# Altium footprint library Connectors.PcbLib: 245 footprints (part 13 of 18)
Each footprint in its own frame and in the unit in brackets; x right, y up, seen from the top. Pads: shape width x height; smd on the part's side, far side on the other; paste and mask are expansions set on the pad; w line width, h text height; cw(c..) or ccw(c..) is an arc to the next point about the centre after c.
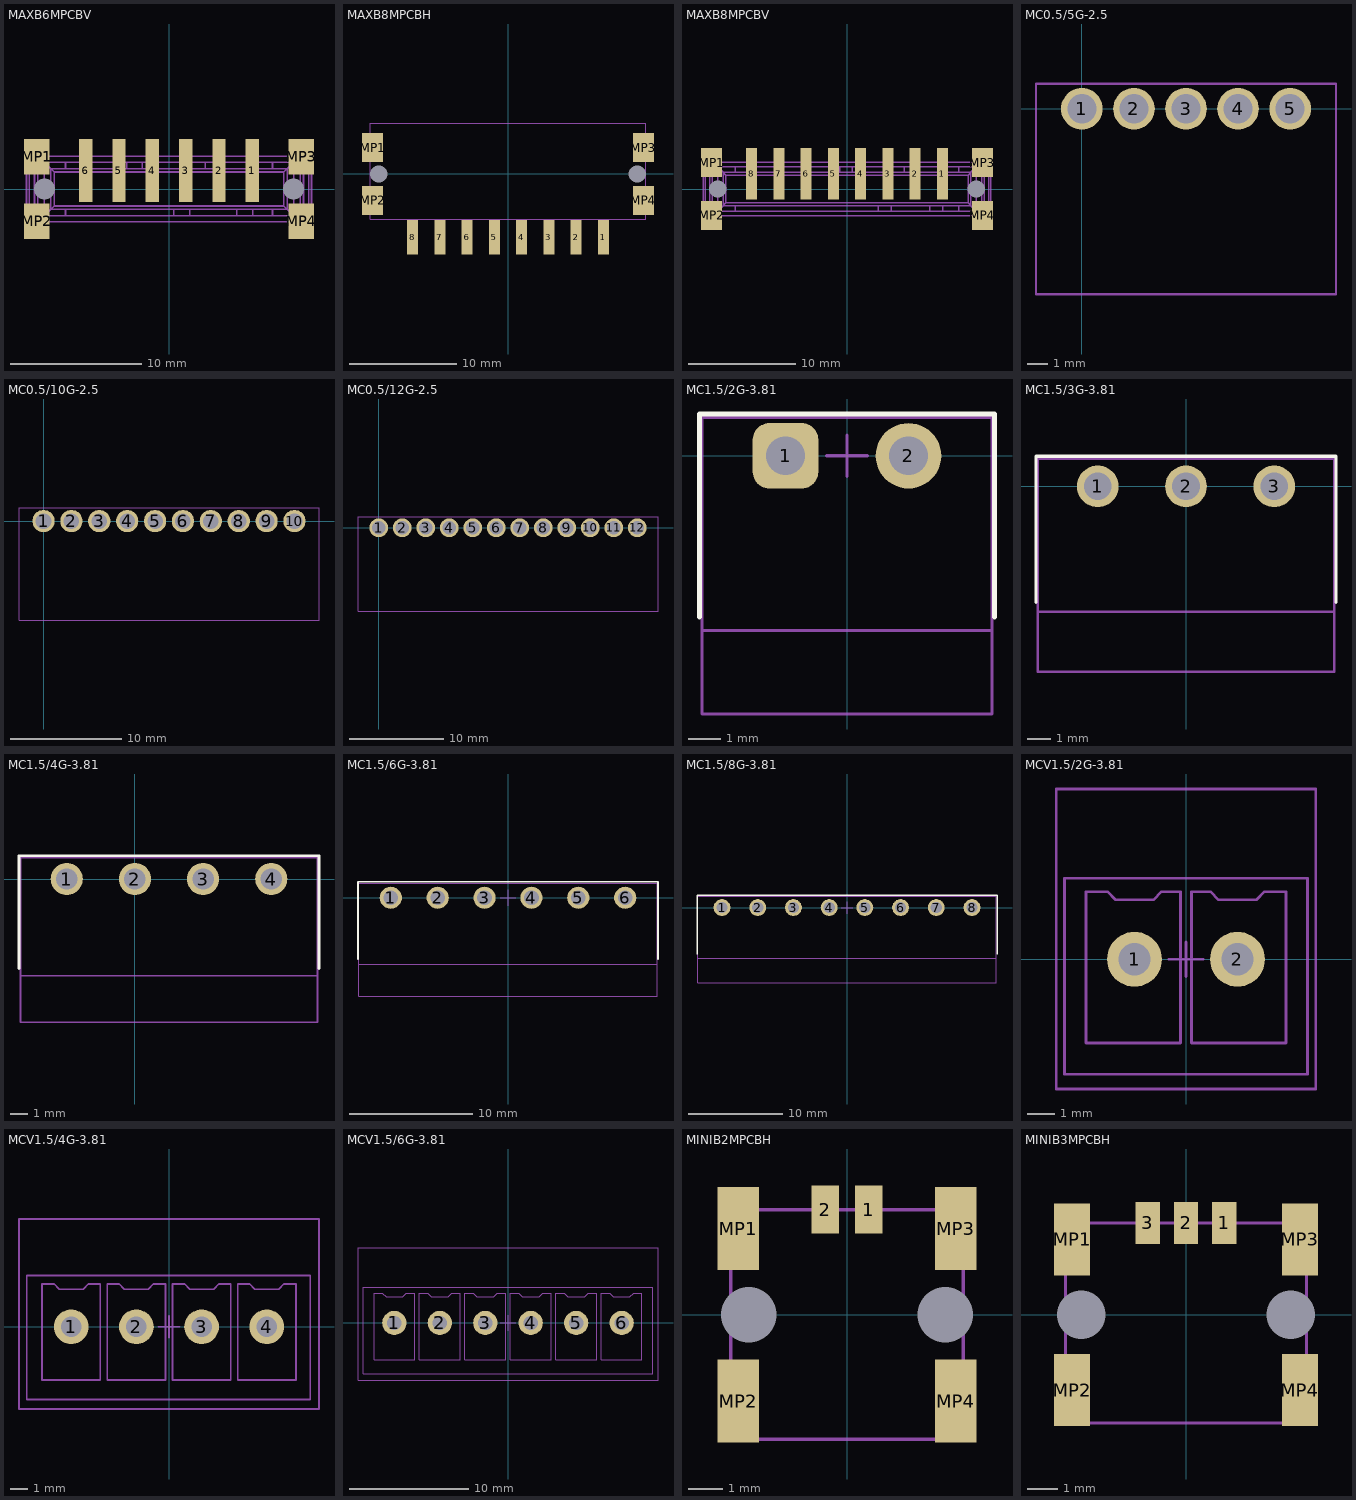
[diagram p12: the footprints below, top view; thin cyan lines are the x and y axes]

## MAXB6MPCBV [mm] "MaxiBridge 6 pin Male vertical"
height 9.4
pads (12):
  rect 1.02x4.8 smd: 1(6.35,1.4) 2(3.81,1.4) 3(1.27,1.4) 4(-1.27,1.4) 5(-3.81,1.4) 6(-6.35,1.4)
  rect 0x0 hole 1.6 unplated: MH1(-9.5,0) MH2(9.5,0)
  rect 1.95x2.7 smd: MP1(-10.075,2.45) MP2(-10.075,-2.45) MP3(10.075,2.45) MP4(10.075,-2.45)
Mechanical 13:
  drawing of 156 lines, arcs and shapes, not listed
3D body: height 9.42, standoff -0.73, extent -10.85,-3.6 10.85,3.6

## MAXB8MPCBH [mm] "MaxiBridge 8 pin MALE HORIZONTAL"
height 5.05
pads (14):
  rect 1.02x3.2 smd: 1(8.89,-5.9) 2(6.35,-5.9) 3(3.81,-5.9) 4(1.27,-5.9) 5(-1.27,-5.9) 6(-3.81,-5.9) 7(-6.35,-5.9) 8(-8.89,-5.9)
  rect 0x0 hole 1.6 unplated: MH1(-12.04,0) MH2(12.04,0)
  rect 1.95x2.7 smd: MP1(-12.615,2.45) MP2(-12.615,-2.45) MP3(12.615,2.45) MP4(12.615,-2.45)
Mechanical 13:
  lines w0.102: -12.81,-4.2 -12.81,4.7 12.81,4.7 12.81,-4.2 -12.81,-4.2
3D body: height 5.07, standoff -0.73, extent -13.39,-7.5 13.39,4.7

## MAXB8MPCBV [mm] "MaxiBridge 8 pin Male vertical"
height 9.4
pads (14):
  rect 1.02x4.8 smd: 1(8.89,1.4) 2(6.35,1.4) 3(3.81,1.4) 4(1.27,1.4) 5(-1.27,1.4) 6(-3.81,1.4) 7(-6.35,1.4) 8(-8.89,1.4)
  rect 0x0 hole 1.6 unplated: MH1(-12.04,0) MH2(12.04,0)
  rect 1.95x2.7 smd: MP1(-12.615,2.45) MP2(-12.615,-2.45) MP3(12.615,2.45) MP4(12.615,-2.45)
Mechanical 13:
  drawing of 170 lines, arcs and shapes, not listed
3D body: height 9.42, standoff -0.73, extent -13.39,-3.6 13.39,3.6

## MC0.5/5G-2.5 [mm] "Combicon conn. 5pin R2.5mm horiz."
height 8.1
pads (5):
  round 2 hole 1.4: 1(0,0) 2(2.5,0) 3(5,0) 4(7.5,0) 5(10,0)
Mechanical 13:
  lines w0.102: -2.2,-8.9 -2.2,1.2 12.2,1.2 12.2,-8.9 -2.2,-8.9
3D body: height 8.1, standoff -3.5, extent -2.2,-8.9 12.2,1.2

## MC0.5/10G-2.5 [mm] "Combicon conn. 10pin R2.5mm horiz."
height 8.1
pads (10):
  round 2 hole 1.4: 1(0,0) 2(2.5,0) 3(5,0) 4(7.5,0) 5(10,0) 6(12.5,0) 7(15,0) 8(17.5,0) 9(20,0) 10(22.5,0)
Mechanical 13:
  lines w0.102: -2.2,-8.9 24.7,-8.9 24.7,1.2 -2.2,1.2 -2.2,-8.9
3D body: height 8.1, standoff -3.5, extent -2.2,-8.9 24.7,1.2

## MC0.5/12G-2.5 [mm] "Combicon conn. 12pin R2.5mm horiz."
height 8.1
pads (12):
  round 2 hole 1.4: 1(0,0) 2(2.5,0) 3(5,0) 4(7.5,0) 5(10,0) 6(12.5,0) 7(15,0) 8(17.5,0) 9(20,0) 10(22.5,0) 11(25,0) 12(27.5,0)
Mechanical 13:
  lines w0.102: -2.2,-8.9 29.7,-8.9 29.7,1.2 -2.2,1.2 -2.2,-8.9
3D body: height 8.1, standoff -3.5, extent -2.2,-8.9 29.7,1.2

## MC1.5/2G-3.81 [mil] "COMBICON 2 POL HOR 3.81mm"
height 285.43
pads (2):
  rrect50% 80x80 hole 47.24: 1(-75,0)
  round 80 hole 47.24: 2(75,0)
Top Overlay:
  lines w5.91: -180,-197 -180,51 180,51 180,-197
Mechanical 13:
  lines w4: -177,-213 177,-213 ; -177,-315 177,-315 177,47 -177,47 -177,-315
Mechanical 15:
  lines w4: -25,0 25,0 ; 0,-25 0,25
3D body: height 285.43, standoff -133.86, extent -177.36,-314.96 177.36,51.18

## MC1.5/3G-3.81 [mm] "COMBICON 3POL HOR 3.81mm"
height 7.25
pads (3):
  round 1.8 hole 1.2: 1(-3.81,0) 2(0,0) 3(3.81,0)
Top Overlay:
  lines w0.15: -6.477,-5.004 -6.477,1.295 6.477,1.295 6.477,-5.004
Mechanical 13:
  lines w0.102: -6.401,-5.41 6.401,-5.41 ; -6.401,-8.001 6.401,-8.001 6.401,1.194 -6.401,1.194 -6.401,-8.001
Mechanical 15:
  lines w0.102: -0.635,0 0.635,0 ; 0,-0.635 0,0.635
3D body: height 7.25, standoff 0, extent -6.402,-8 6.4,1.195

## MC1.5/4G-3.81 [mm] "COMBICON 4POL HOR 3.81mm"
height 7.25
pads (4):
  round 1.8 hole 1.2: 1(-3.81,0) 2(0,0) 3(3.81,0) 4(7.62,0)
Top Overlay:
  lines w0.15: -6.477,-5.004 -6.477,1.295 10.287,1.295 10.287,-5.004
Mechanical 13:
  lines w0.102: -6.401,-5.41 10.211,-5.41 ; -6.401,-8.001 -6.401,1.194 10.211,1.194 10.211,-8.001 -6.401,-8.001
Mechanical 15:
  lines w0.102: -0.635,0 0.635,0 ; 0,-0.635 0,0.635
3D body: height 7.25, standoff 0, extent -6.402,-8.001 10.211,1.195

## MC1.5/6G-3.81 [mm] "COMBICON 6POL HOR 3.81mm"
height 7.25
pads (6):
  round 1.8 hole 1.2: 1(-9.525,0) 2(-5.715,0) 3(-1.905,0) 4(1.905,0) 5(5.715,0) 6(9.525,0)
Top Overlay:
  lines w0.15: -12.192,-5.004 -12.192,1.295 12.192,1.295 12.192,-5.004
Mechanical 13:
  lines w0.102: -12.116,-5.41 12.116,-5.41 ; -12.116,-8.001 12.116,-8.001 12.116,1.194 -12.116,1.194 -12.116,-8.001
Mechanical 15:
  lines w0.102: -0.635,0 0.635,0 ; 0,-0.635 0,0.635
3D body: height 7.25, standoff 0, extent -12.116,-8.001 12.116,1.194

## MC1.5/8G-3.81 [mm] "COMBICON 8POL HOR 3.81mm"
height 7.25
pads (8):
  round 1.8 hole 1.2: 1(-13.335,0) 2(-9.525,0) 3(-5.715,0) 4(-1.905,0) 5(1.905,0) 6(5.715,0) 7(9.525,0) 8(13.335,0)
Top Overlay:
  lines w0.15: -16.002,-5.004 -16.002,1.295 16.002,1.295 16.002,-5.004
Mechanical 13:
  lines w0.102: -15.926,-5.41 15.926,-5.41 ; -15.926,-8.001 15.926,-8.001 15.926,1.194 -15.926,1.194 -15.926,-8.001
Mechanical 15:
  lines w0.102: -0.635,0 0.635,0 ; 0,-0.635 0,0.635
3D body: height 7.25, standoff 0, extent -15.926,-8.001 15.926,1.194

## MCV1.5/2G-3.81 [mil] "COMBICON 2 POL VER 3.81mm"
height 712.6
pads (2):
  round 80 hole 47.24: 1(-75,0) 2(75,0)
Mechanical 13:
  lines w4: -177.17,-167.32 -177.17,118.11 ; 177.17,-167.32 177.17,118.11 ; -145.67,-122.05 -7.87,-122.05 -7.87,98.43 -35.43,98.43 -47.24,86.61 -102.36,86.61 -114.17,98.43 -145.67,98.43 -145.67,-122.05 ; 7.87,-122.05 145.67,-122.05 145.67,98.43 114.17,98.43 102.36,86.61 47.24,86.61 35.43,98.43 7.87,98.43 7.87,-122.05
  lines w4.02: -177.17,-167.32 177.17,-167.32 ; -177.17,118.11 177.17,118.11
Mechanical 15:
  lines w4: -25,0 25,0 ; 0,-25 0,25 ; -188.98,-188.98 188.98,-188.98 188.98,248.03 -188.98,248.03 -188.98,-188.98
3D body: height 362.2, standoff 39.37, extent -177.17,-167.32 177.17,118.11
3D body: height 39.37, standoff 0, extent -177.17,-167.32 177.17,118.11
3D body: height 314.96, standoff -133.86, extent -98.89,-24.08 -50.72,24.08
3D body: height 314.96, standoff -133.86, extent 51.11,-24.08 99.28,24.08

## MCV1.5/4G-3.81 [mil] "COMBICON 4pin vertical  R3.81mm"
height 712.6
pads (4):
  round 80 hole 47.24: 1(-225,0) 2(-75,0) 3(75,0) 4(225,0)
Mechanical 13:
  lines w4: -327.36,-167.32 -327.36,118.11 ; 325,-167.32 325,118.11 ; -292.13,-122.05 -292.13,98.43 -264.17,98.43 -252.36,86.61 -197.24,86.61 -185.43,98.43 -157.87,98.43 -157.87,-122.05 -292.13,-122.05 ; -142.13,-122.05 -142.13,98.43 -114.57,98.43 -102.76,86.61 -47.64,86.61 -35.83,98.43 -7.87,98.43 -7.87,-122.05 -142.13,-122.05 ; 7.87,-122.05 142.13,-122.05 142.13,98.43 114.57,98.43 102.76,86.61 47.64,86.61 35.83,98.43 7.87,98.43 7.87,-122.05 ; 157.87,-122.05 292.13,-122.05 292.13,98.43 264.17,98.43 252.36,86.61 197.24,86.61 185.43,98.43 157.87,98.43 157.87,-122.05
  lines w4.02: -327.36,-167.32 325,-167.32 ; -327.36,118.11 325,118.11 -150,118.11
Mechanical 15:
  lines w4: -25,0 25,0 ; 0,-25 0,25 ; -345,-188.98 345,-188.98 345,248.03 -345,248.03 -345,-188.98
3D body: height 362.8, standoff -133.26, extent -327.36,-167.32 327.36,118.11

## MCV1.5/6G-3.81 [mil] "COMBICON 6 POL VER 3.81mm"
height 712.6
pads (6):
  round 80 hole 47.24: 1(-375,0) 2(-225,0) 3(-75,0) 4(75,0) 5(225,0) 6(375,0)
Mechanical 13:
  lines w4: -477.36,-167.32 -477.36,118.11 ; 477.36,-167.32 477.36,118.11 ; -442.13,-122.05 -307.87,-122.05 -307.87,98.43 -335.43,98.43 -347.24,86.61 -402.36,86.61 -414.17,98.43 -442.13,98.43 -442.13,-122.05 ; -292.13,-122.05 -157.87,-122.05 -157.87,98.43 -185.83,98.43 -197.64,86.61 -252.76,86.61 -264.57,98.43 -292.13,98.43 -292.13,-122.05 ; -142.13,-122.05 -142.13,98.43 -114.17,98.43 -102.36,86.61 -47.24,86.61 -35.43,98.43 -7.87,98.43 -7.87,-122.05 -142.13,-122.05 ; 7.87,-122.05 7.87,98.43 35.43,98.43 47.24,86.61 102.36,86.61 114.17,98.43 142.13,98.43 142.13,-122.05 7.87,-122.05 ; 157.87,-122.05 292.13,-122.05 292.13,98.43 264.57,98.43 252.76,86.61 197.64,86.61 185.83,98.43 157.87,98.43 157.87,-122.05 ; 307.87,-122.05 442.13,-122.05 442.13,98.43 414.17,98.43 402.36,86.61 347.24,86.61 335.43,98.43 307.87,98.43 307.87,-122.05
  lines w4.02: -477.36,-167.32 477.36,-167.32 ; -477.36,118.11 477.36,118.11 ; -300,118.11 177.17,118.11
Mechanical 15:
  lines w4: -25,0 25,0 ; 0,-25 0,25 ; -495,-188.98 -495,248.03 495,248.03 495,-188.98 -495,-188.98
3D body: height 362.2, standoff 39.37, extent 150,-167.32 477.17,118.11
3D body: height 39.37, standoff 0, extent 150,-167.32 477.17,118.11
3D body: height 314.96, standoff -133.86, extent 201.11,-24.08 249.28,24.08
3D body: height 314.96, standoff -133.86, extent 351.11,-24.08 399.28,24.08
3D body: height 362.2, standoff 39.37, extent -477.17,-167.32 -150,118.11
3D body: height 39.37, standoff 0, extent -477.17,-167.32 -150,118.11
3D body: height 314.96, standoff -133.86, extent -398.89,-24.08 -350.72,24.08
3D body: height 314.96, standoff -133.86, extent -248.89,-24.08 -200.72,24.08
3D body: height 314.96, standoff -133.86, extent 51.11,-24.08 99.28,24.08
3D body: height 314.96, standoff -133.86, extent -98.89,-24.08 -50.72,24.08
3D body: height 39.37, standoff 0, extent -150,-167.32 150,118.11
3D body: height 362.2, standoff 39.37, extent -150,-167.32 150,118.11

## MINIB2MPCBH [mm] "MiniBridge 2 pin MALE HORIZONTAL"
height 3
pads (8):
  rect 0.8x1.4 smd: 1(0.635,3.05) 2(-0.635,3.05)
  rect 0x0 hole 1.6 unplated: MH1(-2.845,0) MH2(2.845,0)
  rect 1.2x2.4 smd: MP1(-3.145,2.5) MP2(-3.145,-2.5) MP3(3.145,2.5) MP4(3.145,-2.5)
Mechanical 13:
  lines w0.102: -3.365,-3.6 -3.365,3.05 3.365,3.05 3.365,-3.6 -3.365,-3.6

## MINIB3MPCBH [mm] "MiniBridge 3 pin MALE HORIZONTAL"
height 3
pads (9):
  rect 0.8x1.4 smd: 1(1.27,3.05) 2(0,3.05) 3(-1.27,3.05)
  rect 0x0 hole 1.6 unplated: MH1(-3.48,0) MH2(3.48,0)
  rect 1.2x2.4 smd: MP1(-3.78,2.5) MP2(-3.78,-2.5) MP3(3.78,2.5) MP4(3.78,-2.5)
Mechanical 13:
  lines w0.102: -4,-3.6 -4,3.05 4,3.05 4,-3.6 -4,-3.6